# Altium footprint library 3.10-RJ11 、RJ45、VGA接口.PcbLib: 48 footprints (part 1 of 3)
Each footprint in its own frame and in the unit in brackets; x right, y up, seen from the top. Pads: shape width x height; smd on the part's side, far side on the other; paste and mask are expansions set on the pad; w line width, h text height; cw(c..) or ccw(c..) is an arc to the next point about the centre after c.
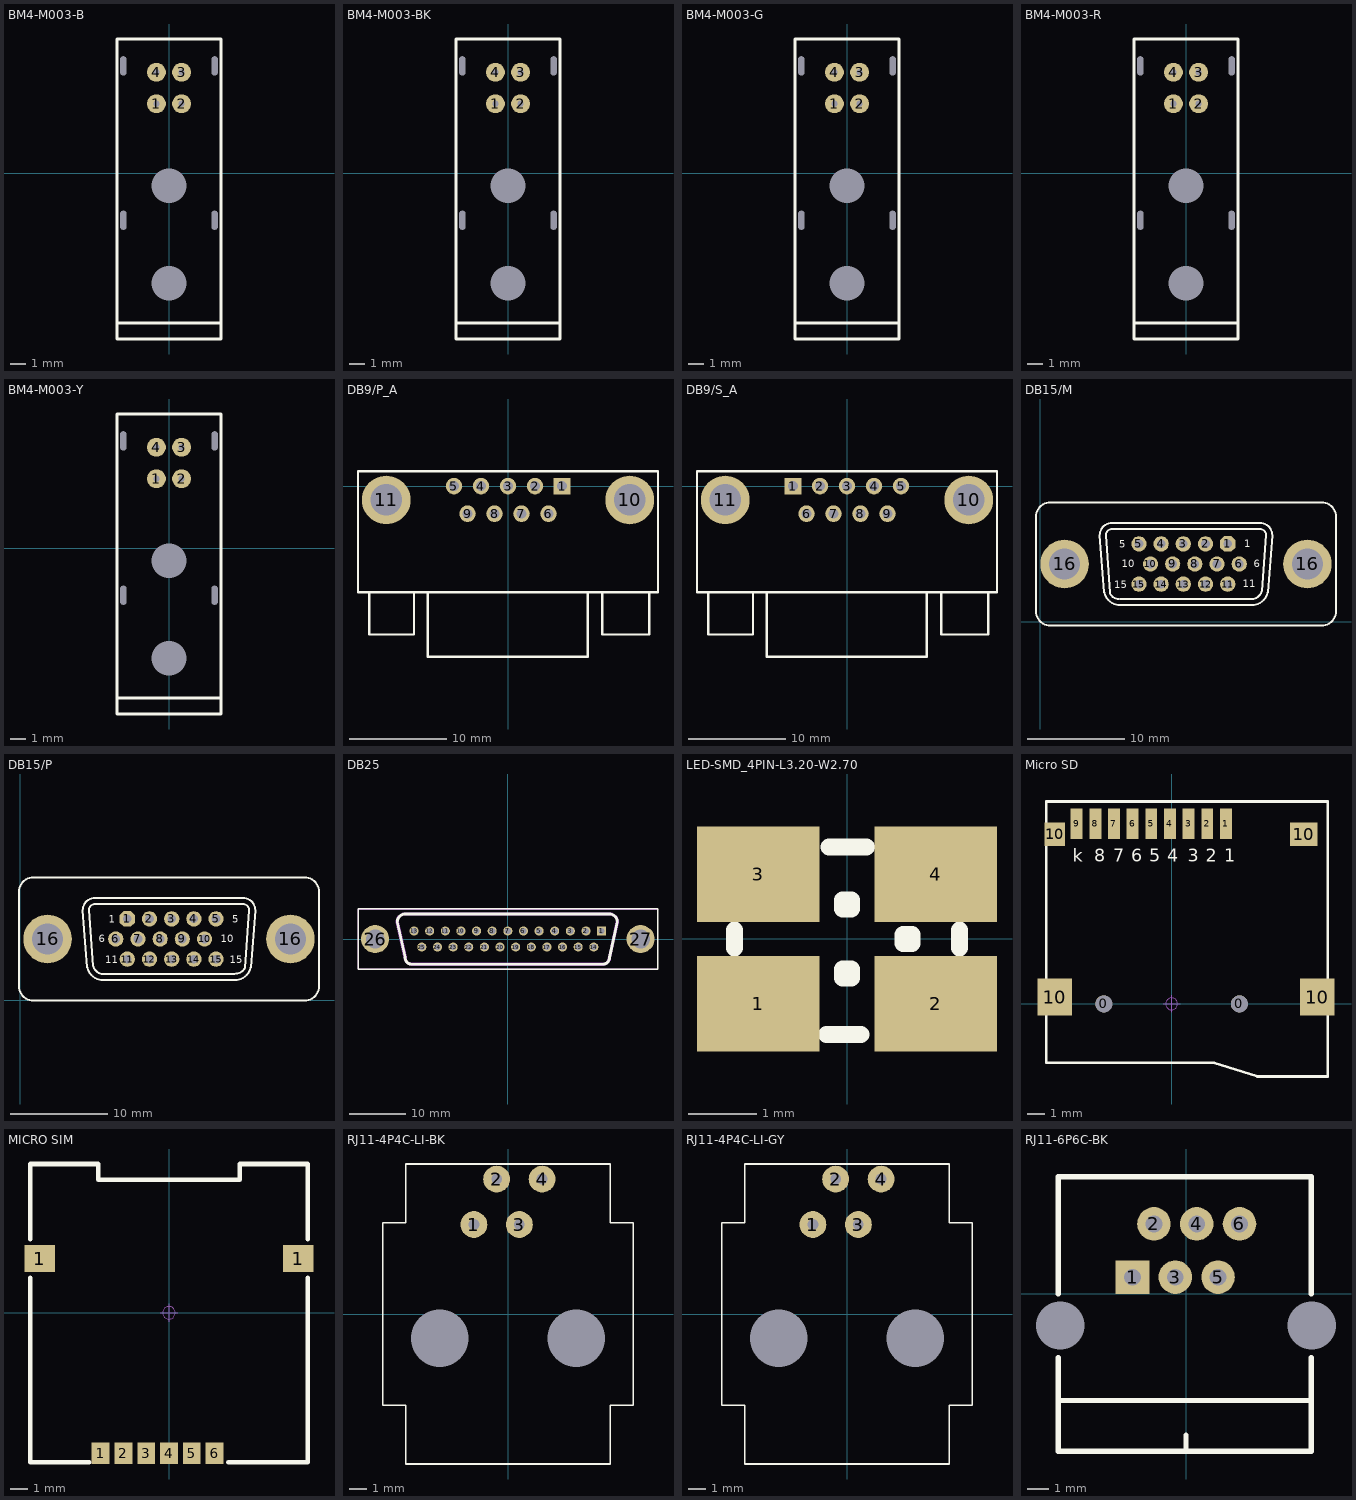
[diagram p0: the footprints below, top view; thin cyan lines are the x and y axes]

## BM4-M003-B [mm] "宝马头板端弯头（蓝色）"
pads (10):
  round 0 hole 0.4 slot 1.2 at 90 deg unplated: 0(-2.9,-3) 0(-2.9,6.8) 0(2.9,-3) 0(2.9,6.8)
  round 0 hole 2.2 unplated: 0(0,-7) 0(0,-0.8)
  round 1.2 hole 0.4: 1(-0.8,4.4) 2(0.8,4.4) 3(0.8,6.4) 4(-0.8,6.4)
Top Overlay:
  lines w0.203: -3.302,-9.525 3.302,-9.525 ; -3.302,-10.541 -3.302,8.509 3.302,8.509 3.302,-10.541 -3.302,-10.541
3D body "BM4-M003-B.STEP": height 6.65, standoff -2.15, extent -3.1,-10.45 3.1,8.45

## BM4-M003-BK [mm] "宝马头板端弯头（黑色）淘宝ID:黄晶宝石   店铺网址:https://shop463601444.taobao.com"
pads (10):
  round 0 hole 0.4 slot 1.2 at 90 deg unplated: 0(-2.9,-3) 0(-2.9,6.8) 0(2.9,-3) 0(2.9,6.8)
  round 0 hole 2.2 unplated: 0(0,-7) 0(0,-0.8)
  round 1.2 hole 0.4: 1(-0.8,4.4) 2(0.8,4.4) 3(0.8,6.4) 4(-0.8,6.4)
Top Overlay:
  lines w0.203: -3.302,-9.525 3.302,-9.525 ; -3.302,-10.541 -3.302,8.509 3.302,8.509 3.302,-10.541 -3.302,-10.541
3D body "BM4-M003-BK.STEP": height 6.65, standoff -2.15, extent -3.1,-10.45 3.1,8.45

## BM4-M003-G [mm] "宝马头板端弯头（绿色）"
pads (10):
  round 0 hole 0.4 slot 1.2 at 90 deg unplated: 0(-2.9,-3) 0(-2.9,6.8) 0(2.9,-3) 0(2.9,6.8)
  round 0 hole 2.2 unplated: 0(0,-7) 0(0,-0.8)
  round 1.2 hole 0.4: 1(-0.8,4.4) 2(0.8,4.4) 3(0.8,6.4) 4(-0.8,6.4)
Top Overlay:
  lines w0.203: -3.302,-9.525 3.302,-9.525 ; -3.302,-10.541 -3.302,8.509 3.302,8.509 3.302,-10.541 -3.302,-10.541
3D body "BM4-M003-G.STEP": height 6.65, standoff -2.15, extent -3.1,-10.45 3.1,8.45

## BM4-M003-R [mm] "宝马头板端弯头（红色） 淘宝ID:黄晶宝石   店铺网址:https://shop463601444.taobao.com"
pads (10):
  round 0 hole 0.4 slot 1.2 at 90 deg unplated: 0(-2.9,-3) 0(-2.9,6.8) 0(2.9,-3) 0(2.9,6.8)
  round 0 hole 2.2 unplated: 0(0,-7) 0(0,-0.8)
  round 1.2 hole 0.4: 1(-0.8,4.4) 2(0.8,4.4) 3(0.8,6.4) 4(-0.8,6.4)
Top Overlay:
  lines w0.203: -3.302,-9.525 3.302,-9.525 ; -3.302,-10.541 -3.302,8.509 3.302,8.509 3.302,-10.541 -3.302,-10.541
3D body "BM4-M003-R.STEP": height 6.65, standoff -2.15, extent -3.1,-10.45 3.1,8.45

## BM4-M003-Y [mm] "宝马头板端弯头（黄色）"
pads (10):
  round 0 hole 0.4 slot 1.2 at 90 deg unplated: 0(-2.9,-3) 0(-2.9,6.8) 0(2.9,-3) 0(2.9,6.8)
  round 0 hole 2.2 unplated: 0(0,-7) 0(0,-0.8)
  round 1.2 hole 0.4: 1(-0.8,4.4) 2(0.8,4.4) 3(0.8,6.4) 4(-0.8,6.4)
Top Overlay:
  lines w0.203: -3.302,-9.525 3.302,-9.525 ; -3.302,-10.541 3.302,-10.541 3.302,8.509 -3.302,8.509 -3.302,-10.541
3D body "BM4-M003-Y.STEP": height 6.65, standoff -2.15, extent -3.1,-10.45 3.1,8.45

## DB9/P_A [mm] "9针公头串口,31*18.5*12.5mm 淘宝ID:黄晶宝石   店铺网址:https://shop463601444.taobao.com"
pads (11):
  rect 1.7x1.7 hole 1: 1(5.546,0)
  round 1.7 hole 1: 2(2.773,0) 3(0,0) 4(-2.773,0) 5(-5.546,0) 6(4.155,-2.84) 7(1.385,-2.84) 8(-1.385,-2.84) 9(-4.155,-2.84)
  round 5 hole 3.25: 10(12.5,-1.42) 11(-12.5,-1.42)
Top Overlay:
  lines w0.254: -14.224,-10.922 -14.224,-15.24 -9.652,-15.24 -9.652,-10.922 ; -8.225,-10.922 -8.225,-17.526 8.175,-17.526 8.175,-10.922 ; 9.652,-10.922 9.652,-15.24 14.478,-15.24 14.478,-10.922 ; -15.4,-10.922 15.4,-10.922 15.4,1.524 -15.4,1.524 -15.4,-10.922
Mechanical 15:
  circle w0.05: c0,0 r0.35
  lines w0.05: -0.5,0 0.5,0 ; 0,-0.5 0,0.5
3D body "DB9 ĸ_A.STEP": height 12.65, standoff -3.16, extent -15.45,-17.247 15.45,1.253

## DB9/S_A [mm] "9针母头串口,31*18.5*12.5mm  淘宝ID:黄晶宝石   店铺网址:https://shop463601444.taobao.com"
pads (11):
  rect 1.7x1.7 hole 1: 1(-5.546,0)
  round 1.7 hole 1: 2(-2.773,0) 3(0,0) 4(2.773,0) 5(5.546,0) 6(-4.155,-2.84) 7(-1.385,-2.84) 8(1.385,-2.84) 9(4.155,-2.84)
  round 5 hole 3.25: 10(12.5,-1.42) 11(-12.5,-1.42)
Top Overlay:
  lines w0.254: -14.224,-10.922 -14.224,-15.24 -9.652,-15.24 -9.652,-10.922 ; -8.225,-10.922 -8.225,-17.526 8.175,-17.526 8.175,-10.922 ; 9.652,-10.922 9.652,-15.24 14.478,-15.24 14.478,-10.922 ; -15.4,-10.922 15.4,-10.922 15.4,1.524 -15.4,1.524 -15.4,-10.922
Mechanical 15:
  circle w0.05: c0,0 r0.35
  lines w0.05: -0.5,0 0.5,0 ; 0,-0.5 0,0.5
3D body "DB9 公_A.STEP": height 12.65, standoff -3.16, extent -15.45,-17.247 15.45,1.253

## DB15/M [mil]
height 62.99
pads (17):
  oct 62x62 hole 35: 1(760,315)
  round 62 hole 35: 2(670,315) 3(580,315) 4(490,315) 5(400,315) 6(806.67,233.33) 7(716.67,233.33) 8(626.67,233.33) 9(536.67,233.33) 10(446.67,233.33) 11(760,151.67) 12(670,151.67) 13(580,151.67) 14(490,151.67) 15(400,151.67)
  round 196.85 hole 125.98: 16(98.33,233.33) 16(1083.33,233.33)
Top Overlay:
  lines w8: 259.17,118.33 240.83,350 cw(c290.83,350) 290.83,400 890.83,400 cw(c890.83,350) 940.83,350 922.5,118.33 ; 259.48,117.21 ccw(c324.17,133.33) 324.17,66.67 857.5,66.67 ccw(c857.5,133.33) 922.18,117.21 ; 282.04,114.42 ccw(c319.17,133.33) 319.17,91.67 ; 282.5,116.67 265.83,350 cw(c290.83,350) 290.83,375 890.83,375 cw(c890.83,350) 915.83,350 899.17,125 ; 324.17,91.67 857.5,91.67 ccw(c857.5,133.33) 898.4,125.38 ; -17.5,41.67 ccw(c40.83,41.67) 40.83,-16.66 1140.83,-16.67 ccw(c1140.83,41.67) 1199.17,41.67 1199.17,425 ccw(c1140.83,425) 1140.83,483.33 40.83,483.33 ccw(c40.83,425) -17.5,425 -17.5,41.67
  text "15" at 300,135 h30
  text "5" at 320,300 h30
  text "10" at 330,220 h30
  text "11" at 820,140 h30
  text "6" at 865,220 h30
  text "1" at 826.35,300.67 h30
3D body "240613——0.STEP": height 489.02, standoff -170.04, extent -5.67,-15.9 1207.32,478.2

## DB15/P [mil]
pads (17):
  oct 62x62 hole 35: 1(435,330)
  round 62 hole 35: 2(525,330) 3(615,330) 4(705,330) 5(795,330) 6(388.33,248.33) 7(478.33,248.33) 8(568.33,248.33) 9(658.33,248.33) 10(748.33,248.33) 11(435,166.67) 12(525,166.67) 13(615,166.67) 14(705,166.67) 15(795,166.67)
  round 196.85 hole 125.98: 16(111.67,248.33) 16(1096.67,248.33)
Top Overlay:
  lines w8: 272.5,133.33 254.17,365 cw(c304.17,365) 304.17,415 904.17,415 cw(c904.17,365) 954.17,365 935.83,133.33 ; 272.81,132.21 ccw(c337.5,148.33) 337.5,81.67 870.83,81.67 ccw(c870.83,148.33) 935.52,132.21 ; 295.83,140 279.17,365 cw(c304.17,365) 304.17,390 904.17,390 cw(c904.17,365) 929.17,365 912.5,131.67 ; 296.6,140.38 ccw(c337.5,148.33) 337.5,106.67 870.83,106.67 ; 875,108.34 ccw(c875,150) 912.12,131.09 ; -4.17,56.67 ccw(c54.17,56.67) 54.17,-1.66 1154.17,-1.67 ccw(c1154.17,56.67) 1212.5,56.67 1212.5,440 ccw(c1154.17,440) 1154.17,498.33 54.17,498.33 ccw(c54.17,440) -4.17,440 -4.17,56.67
  text "5" at 860,315 h30
  text "10" at 815,235 h30
  text "11" at 345,150 h30
  text "6" at 320,235 h30
  text "1" at 360,315 h30
  text "15" at 850,150 h30
3D body "240613——1.STEP": height 500.43, standoff -168.86, extent -2.12,-1.67 1210.46,490.45

## DB25 [mm]
pads (27):
  rect 1.6x1.6 hole 1.1: 1(16.62,1.42)
  round 1.6 hole 1.1: 2(13.85,1.42) 3(11.08,1.42) 4(8.31,1.42) 5(5.54,1.42) 6(2.77,1.42) 7(0,1.42) 8(-2.77,1.42) 9(-5.54,1.42) 10(-8.31,1.42) 11(-11.08,1.42) 12(-13.85,1.42) 13(-16.62,1.42) 14(15.235,-1.42) 15(12.465,-1.42) 16(9.695,-1.42) 17(6.925,-1.42) 18(4.155,-1.42) 19(1.385,-1.42) 20(-1.385,-1.42) 21(-4.155,-1.42) 22(-6.925,-1.42) 23(-9.695,-1.42) 24(-12.465,-1.42) 25(-15.235,-1.42)
  round 5 hole 3.3: 26(-23.52,0) 27(23.52,0)
Top Overlay:
  lines w0.254: -26.544,-5.334 -26.544,5.334 26.542,5.334 26.542,-5.334 -26.544,-5.334
  lines w0.5: -18.194,4.428 ccw(c-18.194,3.031) -19.591,3.031 -18.194,-3.319 ccw(c-17.051,-3.319) -17.051,-4.462 16.858,-4.462 ccw(c16.858,-3.319) 18.001,-3.319 19.398,3.031 ccw(c18.001,3.031) 18.001,4.428 ; -18.033,4.428 17.967,4.428
Mechanical 6:
  drawing of 8 lines, arcs and shapes, not listed
Mechanical 15:
  drawing of 32 lines, arcs and shapes, not listed
3D body "DB25-TH_X0225FT7W5-1~DB25-TH_X0225FT7W5-1~UKPL.STEP": height 12.74, standoff -4.2, extent -26.55,-5.275 26.55,5.275

## LED-SMD_4PIN-L3.20-W2.70 [mm] "封装库来自淘宝卖家 ID：黄晶宝石"
pads (4):
  rect 1.8x1.4 smd: 1(-1.3,-0.95) 2(1.3,-0.95) 3(-1.3,0.95) 4(1.3,0.95)
Top Overlay:
  lines w0.254: -1.651,-0.127 -1.651,0.127 ; -0.3,-1.4 0.2,-1.4 ; -0.265,1.35 0.281,1.35 ; 1.651,-0.127 1.651,0.127 ; -0.064,-0.572 0.063,-0.572 0.063,-0.445 -0.064,-0.445 -0.064,-0.572 ; -0.064,0.444 0.063,0.444 0.063,0.571 -0.064,0.571 -0.064,0.444 ; 0.825,-0.064 0.952,-0.064 0.952,0.063 0.825,0.063 0.825,-0.064
3D body: height 0.8, standoff 0, extent -1.524,-1.397 1.524,1.397

## Micro SD [mm] "淘宝ID:黄晶宝石   店铺网址:https://shop463601444.taobao.com"
pads (15):
  round 1 hole 1 unplated: 0(-4,0) 0(4,0)
  rect 0.7x1.8 smd: 1(3.2,10.627) 2(2.1,10.627) 3(1,10.627) 4(-0.1,10.627) 5(-1.2,10.627) 6(-2.3,10.627) 7(-3.4,10.627) 8(-4.5,10.627) 9(-5.6,10.627)
  rect 2.032x2.2 smd: 10(-6.9,0.4) 10(8.6,0.4)
  rect 1.2x1.4 smd: 10(-6.9,10)
  rect 1.6x1.4 smd: 10(7.8,10)
Top Overlay:
  lines w0.152: 2.489,-3.47 5.054,-4.283 9.204,-4.283 9.204,11.938 -7.402,11.938 -7.402,-3.47 2.514,-3.47
  text "1" at 3.098,8.382 h0.76
  text "2" at 2.006,8.382 h0.76
  text "3" at 0.939,8.382 h0.76
  text "4" at -0.254,8.382 h0.76
  text "5" at -1.321,8.382 h0.76
  text "6" at -2.388,8.382 h0.76
  text "7" at -3.455,8.382 h0.76
  text "8" at -4.572,8.382 h0.76
  text "k" at -5.842,8.382 h0.76
Mechanical 15:
  circle w0.05: c0,0 r0.35
  lines w0.05: -0.5,0 0.5,0 ; 0,-0.5 0,0.5
3D body "TF 卡座-A.STE": height 2, standoff -0.45, extent -7.05,-4 8.95,11.25

## MICRO SIM [mm] "16.30mm*14.66mm*1.8mm(长*宽*厚）淘宝ID:黄晶宝石   店铺网址:https://shop463601444.taobao.com"
pads (8):
  rect 1.7x1.5 smd: 1(-7.2,3.02) 1(7.2,3.02)
  rect 1x1.2 smd: 1(-3.81,-7.83) 2(-2.54,-7.83) 3(-1.27,-7.83) 4(0,-7.83) 5(1.27,-7.83) 6(2.54,-7.83)
Top Overlay:
  lines w0.254: -7.747,1.949 -7.747,-8.338 -4.445,-8.338 ; -7.747,4.108 -7.747,8.299 -3.937,8.299 -3.937,7.41 3.937,7.41 3.937,8.299 7.747,8.299 7.747,4.108 ; 3.302,-8.338 7.747,-8.338 7.747,1.949
Mechanical 15:
  circle w0.05: c0,0 r0.35
  lines w0.05: -0.5,0 0.5,0 ; 0,-0.5 0,0.5
3D body "MICRO SIM.STEP": height 1.85, standoff 0.04, extent -7.58,-8.13 7.58,8.13

## RJ11-4P4C-LI-BK [mm] "16.5mm*13.8mm*16.38mm(长*宽*高) 淘宝ID:黄晶宝石   店铺网址:https://shop463601444.taobao.com"
pads (6):
  round 0 hole 3.2: 0(-3.81,-1.35) 0(3.81,-1.35)
  round 1.5 hole 0.6: 1(-1.905,5) 2(-0.635,7.54) 3(0.635,5) 4(1.905,7.54)
Top Overlay:
  lines w0.1: -7,-5.1 -7,5.1 -5.715,5.1 -5.715,8.382 5.715,8.382 5.715,5.1 7,5.1 7,-5.1 5.715,-5.1 5.715,-8.382 -5.715,-8.382 -5.715,-5.1 -7,-5.1
3D body "RJ11-4P4C-BK.STEP": height 16.38, standoff -3.2, extent -6.9,-8.25 6.9,8.25

## RJ11-4P4C-LI-GY [mm] "16.5mm*13.8mm*16.38mm(长*宽*高) 淘宝ID:黄晶宝石   店铺网址:https://shop463601444.taobao.com"
pads (6):
  round 0 hole 3.2: 0(-3.81,-1.35) 0(3.81,-1.35)
  round 1.5 hole 0.6: 1(-1.905,5) 2(-0.635,7.54) 3(0.635,5) 4(1.905,7.54)
Top Overlay:
  lines w0.1: -7,-5.1 -7,5.1 -5.715,5.1 -5.715,8.382 5.715,8.382 5.715,5.1 7,5.1 7,-5.1 5.715,-5.1 5.715,-8.382 -5.715,-8.382 -5.715,-5.1 -7,-5.1
3D body "RJ11-4P4C-GY.STEP": height 16.38, standoff -3.2, extent -6.9,-8.25 6.9,8.25

## RJ11-6P6C-BK [mm] "12mm*12mm*14.55mm(长*宽*高) 淘宝ID:黄晶宝石   店铺网址:https://shop463601444.taobao.com"
pads (8):
  round 0 hole 2.3: 0(-6,-1.5) 0(6,-1.5)
  rect 1.6x1.6 hole 0.8: 1(-2.55,0.8)
  round 1.6 hole 0.8: 2(-1.53,3.34) 3(-0.51,0.8) 4(0.51,3.34) 5(1.53,0.8) 6(2.55,3.34)
Top Overlay:
  lines w0.254: -6.096,-5.08 5.969,-5.08 ; -6.096,-3.048 -6.096,-7.5 5.969,-7.5 5.969,-3.048 ; -6.096,0 -6.096,5.588 5.969,5.588 5.969,0 ; 0,-7.5 0,-6.731
3D body "RJ11-6P6C-WI-BK.STEP": height 14.6, standoff -3.45, extent -7.15,-7.5 7.15,5.5